# Altium footprint library SAMTEC THD.PcbLib: 161 footprints (part 2 of 12)
Each footprint in its own frame and in the unit in brackets; x right, y up, seen from the top. Pads: shape width x height; smd on the part's side, far side on the other; paste and mask are expansions set on the pad; w line width, h text height; cw(c..) or ccw(c..) is an arc to the next point about the centre after c.
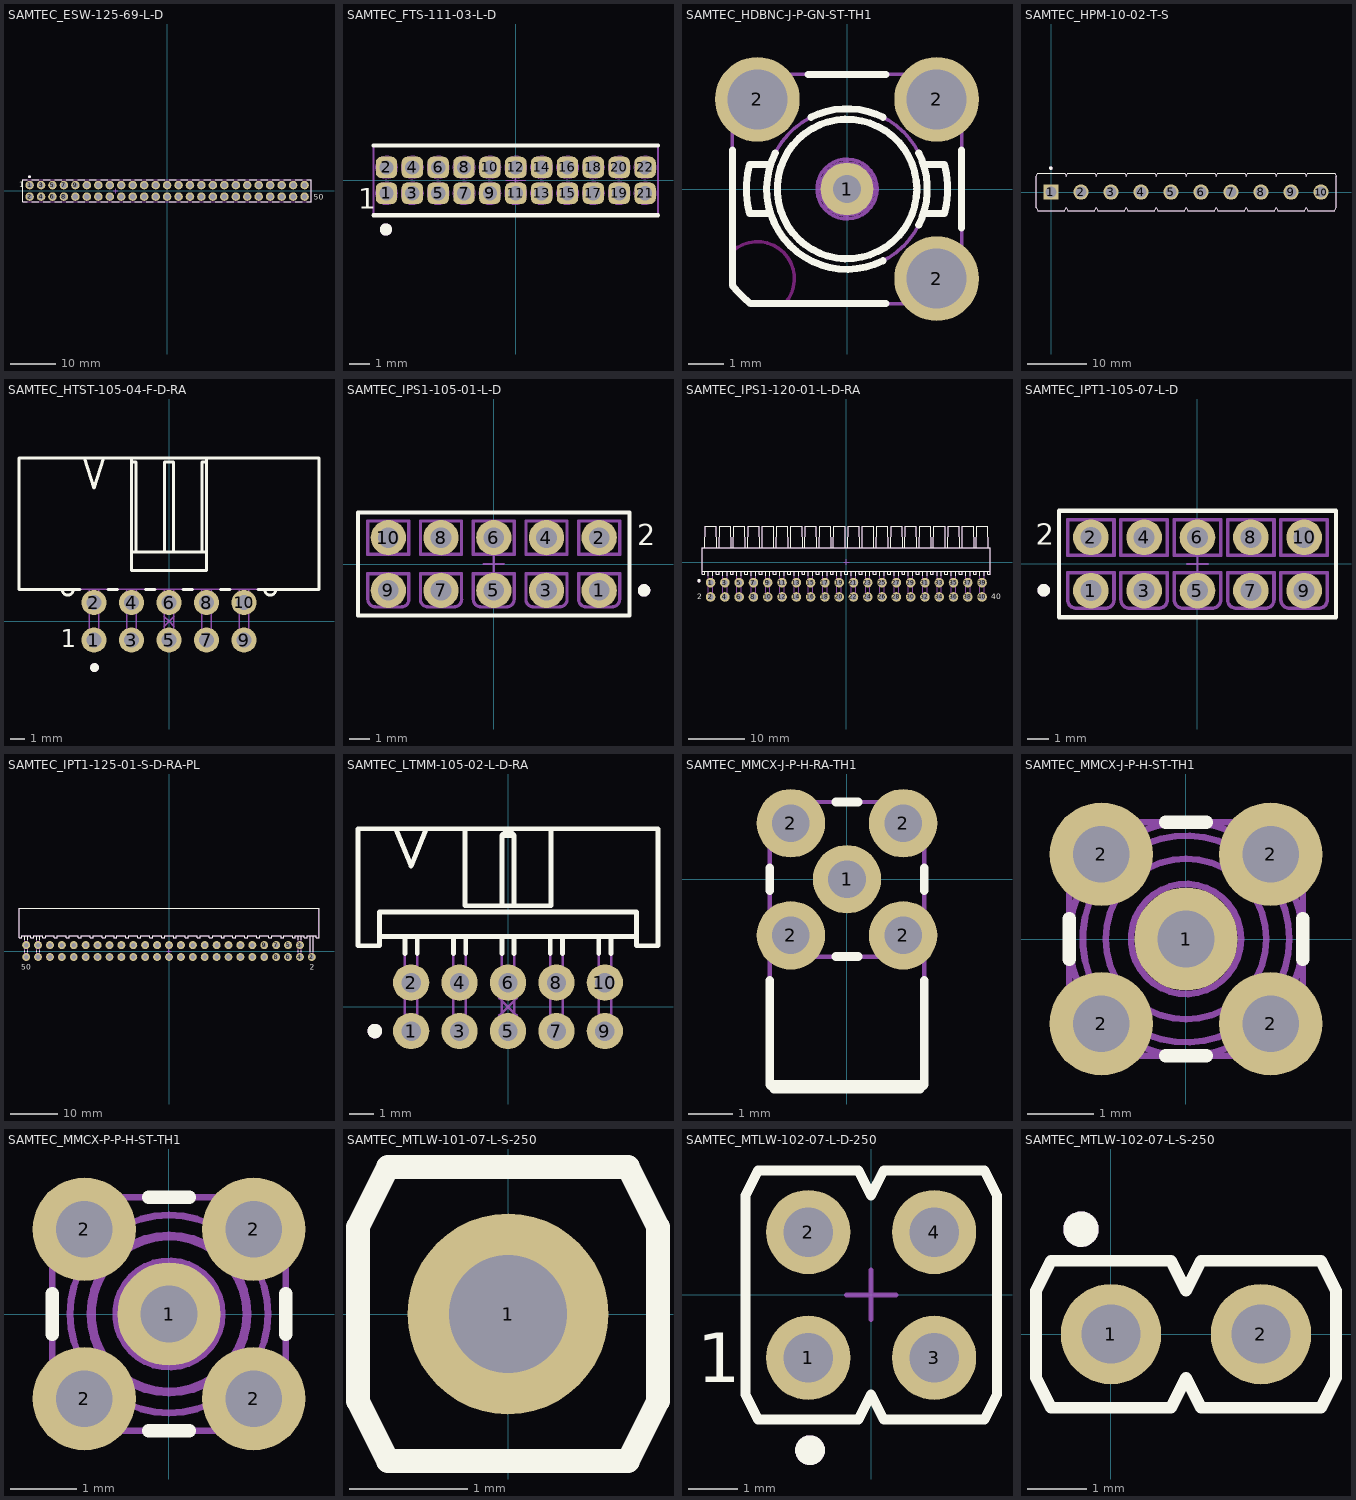
[diagram p1: the footprints below, top view; thin cyan lines are the x and y axes]

## SAMTEC_ESW-125-69-L-D [mm] "50 Contacts, Pitch 2.54mm, Dual Row Through Mount Straight Elevated Socket, Low Insertion Force (Lead Length 4.57mm)"
height 18.67
pads (50):
  round 1.9 hole 1.2: 1(-30.48,1.27) 2(-30.48,-1.27) 3(-27.94,1.27) 4(-27.94,-1.27) 5(-25.4,1.27) 6(-25.4,-1.27) 7(-22.86,1.27) 8(-22.86,-1.27) 9(-20.32,1.27) 10(-20.32,-1.27) 11(-17.78,1.27) 12(-17.78,-1.27) 13(-15.24,1.27) 14(-15.24,-1.27) 15(-12.7,1.27) 16(-12.7,-1.27) 17(-10.16,1.27) 18(-10.16,-1.27) 19(-7.62,1.27) 20(-7.62,-1.27) 21(-5.08,1.27) 22(-5.08,-1.27) 23(-2.54,1.27) 24(-2.54,-1.27) 25(0,1.27) 26(0,-1.27) 27(2.54,1.27) 28(2.54,-1.27) 29(5.08,1.27) 30(5.08,-1.27) 31(7.62,1.27) 32(7.62,-1.27) 33(10.16,1.27) 34(10.16,-1.27) 35(12.7,1.27) 36(12.7,-1.27) 37(15.24,1.27) 38(15.24,-1.27) 39(17.78,1.27) 40(17.78,-1.27) 41(20.32,1.27) 42(20.32,-1.27) 43(22.86,1.27) 44(22.86,-1.27) 45(25.4,1.27) 46(25.4,-1.27) 47(27.94,1.27) 48(27.94,-1.27) 49(30.48,1.27) 50(30.48,-1.27)
Top Overlay:
  circle w0.3: c-30.515,3.135 r0.15
  lines w0.2: -30.964,-2.476 -32.004,-2.476 -32.004,2.476 -30.964,2.476 ; -29.996,-2.476 -28.424,-2.476 ; -29.996,2.476 -28.424,2.476 ; -27.456,-2.476 -25.884,-2.476 ; -27.456,2.476 -25.884,2.476 ; -24.916,-2.476 -23.344,-2.476 ; -24.916,2.476 -23.344,2.476 ; -22.376,-2.476 -20.804,-2.476 ; -22.376,2.476 -20.804,2.476 ; -19.836,-2.476 -18.264,-2.476 ; -19.836,2.476 -18.264,2.476 ; -17.296,-2.476 -15.724,-2.476 ; -17.296,2.476 -15.724,2.476 ; -14.756,-2.476 -13.184,-2.476 ; -14.756,2.476 -13.184,2.476 ; -12.216,-2.476 -10.644,-2.476 ; -12.216,2.476 -10.644,2.476 ; -9.676,-2.476 -8.104,-2.476 ; -9.676,2.476 -8.104,2.476 ; -7.136,-2.476 -5.564,-2.476 ; -7.136,2.476 -5.564,2.476 ; -4.596,-2.476 -3.024,-2.476 ; -4.596,2.476 -3.024,2.476 ; -2.056,-2.476 -0.484,-2.476 ; -2.056,2.476 -0.484,2.476 ; 0.484,-2.476 2.056,-2.476 ; 0.484,2.476 2.056,2.476 ; 3.024,-2.476 4.596,-2.476 ; 3.024,2.476 4.596,2.476 ; 5.564,-2.476 7.136,-2.476 ; 5.564,2.476 7.136,2.476 ; 8.104,-2.476 9.676,-2.476 ; 8.104,2.476 9.676,2.476 ; 10.644,-2.476 12.216,-2.476 ; 10.644,2.476 12.216,2.476 ; 13.184,-2.476 14.756,-2.476 ; 13.184,2.476 14.756,2.476 ; 15.724,-2.476 17.296,-2.476 ; 15.724,2.476 17.296,2.476 ; 18.264,-2.476 19.836,-2.476 ; 18.264,2.476 19.836,2.476 ; 20.804,-2.476 22.376,-2.476 ; 20.804,2.476 22.376,2.476 ; 23.344,-2.476 24.916,-2.476 ; 23.344,2.476 24.916,2.476 ; 25.884,-2.476 27.456,-2.476 ; 25.884,2.476 27.456,2.476 ; 28.424,-2.476 29.996,-2.476 ; 28.424,2.476 29.996,2.476 ; 30.964,-2.476 32.004,-2.476 32.004,2.476 30.964,2.476
  text "1" at -32.827,0.772 h1.2
  text "50" at 32.485,-1.925 h1.2
Mechanical 8:
  drawing of 204 lines, arcs and shapes, not listed
Mechanical 14:
  drawing of 205 lines, arcs and shapes, not listed
  text "1" at -32.827,0.772 h1.2
  text "50" at 32.485,-1.925 h1.2
3D body "SAMTEC_ESW-125-69-L-D.stp": height 18.67, standoff -4.57, extent -32.004,-2.54 32.004,2.54

## SAMTEC_FTS-111-03-L-D [mm] "22 Contacts - Pitch 1.27mm - Dual Row THD Straight Strip Header"
height 2.51
pads (22):
  rrect50% 1.05x1.05 hole 0.7: 1(-6.35,-0.635) 2(-6.35,0.635) 3(-5.08,-0.635) 4(-5.08,0.635) 5(-3.81,-0.635) 6(-3.81,0.635) 7(-2.54,-0.635) 8(-2.54,0.635) 9(-1.27,-0.635) 10(-1.27,0.635) 11(0,-0.635) 12(0,0.635) 13(1.27,-0.635) 14(1.27,0.635) 15(2.54,-0.635) 16(2.54,0.635) 17(3.81,-0.635) 18(3.81,0.635) 19(5.08,-0.635) 20(5.08,0.635) 21(6.35,-0.635) 22(6.35,0.635)
Top Overlay:
  circle w0.3: c-6.373,-2.413 r0.15
  lines w0.2: -6.985,-1.714 6.985,-1.714 ; -6.985,1.714 6.985,1.714
  text "1" at -7.747,-1.397 h1
Mechanical 8:
  circle w0.05: c0,0.635 r0.35
  circle w0.05: c0,0.635 r0.55
  circle w0.05: c0,-0.635 r0.35
  circle w0.05: c0,-0.635 r0.55
  circle w0.05: c1.27,0.635 r0.35
  circle w0.05: c1.27,0.635 r0.55
  circle w0.05: c1.27,-0.635 r0.35
  circle w0.05: c1.27,-0.635 r0.55
  circle w0.05: c2.54,0.635 r0.35
  circle w0.05: c2.54,0.635 r0.55
  circle w0.05: c2.54,-0.635 r0.35
  circle w0.05: c2.54,-0.635 r0.55
  circle w0.05: c3.81,0.635 r0.35
  circle w0.05: c3.81,0.635 r0.55
  circle w0.05: c3.81,-0.635 r0.35
  circle w0.05: c3.81,-0.635 r0.55
  circle w0.05: c-1.27,0.635 r0.35
  circle w0.05: c-1.27,0.635 r0.55
  circle w0.05: c-1.27,-0.635 r0.35
  circle w0.05: c-1.27,-0.635 r0.55
  circle w0.05: c-2.54,0.635 r0.35
  circle w0.05: c-2.54,0.635 r0.55
  circle w0.05: c-2.54,-0.635 r0.35
  circle w0.05: c-2.54,-0.635 r0.55
  circle w0.05: c-3.81,0.635 r0.35
  circle w0.05: c-3.81,0.635 r0.55
  circle w0.05: c-3.81,-0.635 r0.35
  circle w0.05: c-3.81,-0.635 r0.55
  circle w0.05: c-5.08,0.635 r0.35
  circle w0.05: c-5.08,0.635 r0.55
  circle w0.05: c-5.08,-0.635 r0.35
  circle w0.05: c-5.08,-0.635 r0.55
  circle w0.05: c-6.35,0.635 r0.35
  circle w0.05: c-6.35,0.635 r0.55
  circle w0.05: c-6.35,-0.635 r0.35
  circle w0.05: c-6.35,-0.635 r0.55
  circle w0.05: c5.08,0.635 r0.35
  circle w0.05: c5.08,0.635 r0.55
  circle w0.05: c5.08,-0.635 r0.35
  circle w0.05: c5.08,-0.635 r0.55
  circle w0.05: c6.35,0.635 r0.35
  circle w0.05: c6.35,0.635 r0.55
  circle w0.05: c6.35,-0.635 r0.35
  circle w0.05: c6.35,-0.635 r0.55
  lines w0.05: -6.85,-0.635 -6.35,-0.635 ; -6.85,0.635 -6.35,0.635 ; -6.35,-1.135 -6.35,-0.635 ; -6.35,-0.135 -6.35,-0.635 ; -6.35,0.135 -6.35,0.635 ; -6.35,1.135 -6.35,0.635 ; -5.85,-0.635 -6.35,-0.635 ; -5.85,0.635 -6.35,0.635 ; -5.58,-0.635 -5.08,-0.635 ; -5.58,0.635 -5.08,0.635 ; -5.08,-1.135 -5.08,-0.635 ; -5.08,-0.135 -5.08,-0.635 ; -5.08,0.135 -5.08,0.635 ; -5.08,1.135 -5.08,0.635 ; -4.58,-0.635 -5.08,-0.635 ; -4.58,0.635 -5.08,0.635 ; -4.31,-0.635 -3.81,-0.635 ; -4.31,0.635 -3.81,0.635 ; -3.81,-1.135 -3.81,-0.635 ; -3.81,-0.135 -3.81,-0.635 ; -3.81,0.135 -3.81,0.635 ; -3.81,1.135 -3.81,0.635 ; -3.31,-0.635 -3.81,-0.635 ; -3.31,0.635 -3.81,0.635 ; -3.04,-0.635 -2.54,-0.635 ; -3.04,0.635 -2.54,0.635 ; -2.54,-1.135 -2.54,-0.635 ; -2.54,-0.135 -2.54,-0.635 ; -2.54,0.135 -2.54,0.635 ; -2.54,1.135 -2.54,0.635 ; -2.04,-0.635 -2.54,-0.635 ; -2.04,0.635 -2.54,0.635 ; -1.77,-0.635 -1.27,-0.635 ; -1.77,0.635 -1.27,0.635 ; -1.27,-1.135 -1.27,-0.635 ; -1.27,-0.135 -1.27,-0.635 ; -1.27,0.135 -1.27,0.635 ; -1.27,1.135 -1.27,0.635 ; -0.77,-0.635 -1.27,-0.635 ; -0.77,0.635 -1.27,0.635 ; -0.5,-0.635 0,-0.635 ; -0.5,0 0,0 ; -0.5,0.635 0,0.635 ; 0,-1.135 0,-0.635 ; 0,-0.5 0,0 ; 0,-0.135 0,-0.635 ; 0,0.135 0,0.635 ; 0,0.5 0,0 ; 0,1.135 0,0.635 ; 0.5,-0.635 0,-0.635 ; 0.5,0 0,0 ; 0.5,0.635 0,0.635 ; 0.77,-0.635 1.27,-0.635 ; 0.77,0.635 1.27,0.635 ; 1.27,-1.135 1.27,-0.635 ; 1.27,-0.135 1.27,-0.635 ; 1.27,0.135 1.27,0.635 ; 1.27,1.135 1.27,0.635 ; 1.77,-0.635 1.27,-0.635 ; 1.77,0.635 1.27,0.635 ; 2.04,-0.635 2.54,-0.635 ; 2.04,0.635 2.54,0.635 ; 2.54,-1.135 2.54,-0.635 ; 2.54,-0.135 2.54,-0.635 ; 2.54,0.135 2.54,0.635 ; 2.54,1.135 2.54,0.635 ; 3.04,-0.635 2.54,-0.635 ; 3.04,0.635 2.54,0.635 ; 3.31,-0.635 3.81,-0.635 ; 3.31,0.635 3.81,0.635 ; 3.81,-1.135 3.81,-0.635 ; 3.81,-0.135 3.81,-0.635 ; 3.81,0.135 3.81,0.635 ; 3.81,1.135 3.81,0.635 ; 4.31,-0.635 3.81,-0.635 ; 4.31,0.635 3.81,0.635 ; 4.58,-0.635 5.08,-0.635 ; 4.58,0.635 5.08,0.635 ; 5.08,-1.135 5.08,-0.635 ; 5.08,-0.135 5.08,-0.635 ; 5.08,0.135 5.08,0.635 ; 5.08,1.135 5.08,0.635 ; 5.58,-0.635 5.08,-0.635 ; 5.58,0.635 5.08,0.635 ; 5.85,-0.635 6.35,-0.635 ; 5.85,0.635 6.35,0.635 ; 6.35,-1.135 6.35,-0.635 ; 6.35,-0.135 6.35,-0.635 ; 6.35,0.135 6.35,0.635 ; 6.35,1.135 6.35,0.635 ; 6.85,-0.635 6.35,-0.635 ; 6.85,0.635 6.35,0.635
Mechanical 14:
  circle w0.3: c-6.373,-2.413 r0.15
  lines w0.1: -6.985,-1.714 -6.985,1.714 6.985,1.714 6.985,-1.714 -6.985,-1.714 ; -6.553,-0.838 -6.147,-0.838 -6.147,-0.432 -6.553,-0.432 -6.553,-0.838 ; -6.553,0.432 -6.147,0.432 -6.147,0.838 -6.553,0.838 -6.553,0.432 ; -5.283,-0.838 -4.877,-0.838 -4.877,-0.432 -5.283,-0.432 -5.283,-0.838 ; -5.283,0.432 -4.877,0.432 -4.877,0.838 -5.283,0.838 -5.283,0.432 ; -4.013,-0.838 -3.607,-0.838 -3.607,-0.432 -4.013,-0.432 -4.013,-0.838 ; -4.013,0.432 -3.607,0.432 -3.607,0.838 -4.013,0.838 -4.013,0.432 ; -2.743,-0.838 -2.337,-0.838 -2.337,-0.432 -2.743,-0.432 -2.743,-0.838 ; -2.743,0.432 -2.337,0.432 -2.337,0.838 -2.743,0.838 -2.743,0.432 ; -1.473,-0.838 -1.067,-0.838 -1.067,-0.432 -1.473,-0.432 -1.473,-0.838 ; -1.473,0.432 -1.067,0.432 -1.067,0.838 -1.473,0.838 -1.473,0.432 ; -0.203,-0.838 0.203,-0.838 0.203,-0.432 -0.203,-0.432 -0.203,-0.838 ; -0.203,0.432 0.203,0.432 0.203,0.838 -0.203,0.838 -0.203,0.432 ; 1.067,-0.838 1.473,-0.838 1.473,-0.432 1.067,-0.432 1.067,-0.838 ; 1.067,0.432 1.473,0.432 1.473,0.838 1.067,0.838 1.067,0.432 ; 2.337,-0.838 2.743,-0.838 2.743,-0.432 2.337,-0.432 2.337,-0.838 ; 2.337,0.432 2.743,0.432 2.743,0.838 2.337,0.838 2.337,0.432 ; 3.607,-0.838 4.013,-0.838 4.013,-0.432 3.607,-0.432 3.607,-0.838 ; 3.607,0.432 4.013,0.432 4.013,0.838 3.607,0.838 3.607,0.432 ; 4.877,-0.838 5.283,-0.838 5.283,-0.432 4.877,-0.432 4.877,-0.838 ; 4.877,0.432 4.877,0.838 5.283,0.838 5.283,0.432 4.877,0.432 ; 6.147,-0.838 6.553,-0.838 6.553,-0.432 6.147,-0.432 6.147,-0.838 ; 6.147,0.432 6.147,0.838 6.553,0.838 6.553,0.432 6.147,0.432
  text "1" at -7.747,-1.397 h1
3D body "SAMTEC_FTS-111-03-L-D.stp": height 2.51, standoff -2.29, extent -6.985,-1.714 6.985,1.715

## SAMTEC_HDBNC-J-P-GN-ST-TH1 [mm] "75 Ohm BNC Straight Through-hole PCB Jack"
height 8.25
pads (4):
  round 1.5 hole 0.8: 1(0,0)
  round 2.4 hole 1.7: 2(-2.54,2.54) 2(2.54,-2.54) 2(2.54,2.54)
Top Layer keep-out:
  lines w0.1: -3.25,-2.739 ccw(c0,0) -2.739,-3.25 -1.766,-3.25 ccw(c-2.54,-2.54) -3.25,-1.766 -3.25,-2.739
Top Overlay:
  circle w0.2: c0,0 r1.977
  lines w0.2: -3.25,1.106 -3.25,-2.739 ccw(c0,0) -2.739,-3.25 1.106,-3.25 ; -2.165,-0.7 -2.768,-0.7 cw(c0,0) -2.768,0.7 -2.165,0.7 ; -2.032,1.023 ccw(c0,0) 1.023,-2.032 ; -1.106,3.25 1.106,3.25 ; -1.023,2.032 cw(c0,0) 1.023,2.032 ; 2.032,-1.023 ccw(c0,0) 2.032,1.023 ; 2.165,-0.7 2.768,-0.7 ccw(c0,0) 2.768,0.7 2.165,0.7 ; 3.25,-1.106 3.25,1.106
Mechanical 8:
  circle w0.1: c0,0 r0.75
  lines w0.1: -3.04,2.54 -2.54,2.54 ; -2.54,2.04 -2.54,2.54 ; -2.54,3.04 -2.54,2.54 ; -2.04,2.54 -2.54,2.54 ; -0.5,0 0,0 ; 0,-0.5 0,0 ; 0,0.5 0,0 ; 0.5,0 0,0 ; 2.04,-2.54 2.54,-2.54 ; 2.04,2.54 2.54,2.54 ; 2.54,-3.04 2.54,-2.54 ; 2.54,-2.04 2.54,-2.54 ; 2.54,2.04 2.54,2.54 ; 2.54,3.04 2.54,2.54 ; 3.04,-2.54 2.54,-2.54 ; 3.04,2.54 2.54,2.54
Mechanical 14:
  circle w0.1: c0,0 r2.275
  circle w0.1: c0,0 r0.215
  circle w0.1: c0,0 r0.65
  circle w0.1: c0,0 r0.85
  circle w0.1: c0,0 r1.977
  lines w0.1: -2.165,-0.7 -2.768,-0.7 cw(c0,0) -2.768,0.7 -2.165,0.7 ; 2.165,-0.7 2.768,-0.7 ccw(c0,0) 2.768,0.7 2.165,0.7 ; -3.25,-2.739 ccw(c0,0) -2.739,-3.25 2.739,-3.25 ccw(c0,0) 3.25,-2.739 3.25,2.739 ccw(c0,0) 2.739,3.25 -2.739,3.25 ccw(c0,0) -3.25,2.739 -3.25,-2.739
3D body "SAMTEC_HDBNC-J-P-GN-ST-TH1.stp": height 8.25, standoff -4, extent -3.25,-3.25 3.25,3.25

## SAMTEC_HPM-10-02-T-S [mm] "10 Contacts - Pitch 5.08mm - Single Row  Through Mount Straigh Header (Post Lead 13.21mm, Tail Lead 4.57mm, Insulator 2.54mm)"
height 15.75
pads (10):
  rect 2.6x2.6 hole 1.9: 1(0,0)
  round 2.6 hole 1.9: 2(5.08,0) 3(10.16,0) 4(15.24,0) 5(20.32,0) 6(25.4,0) 7(30.48,0) 8(35.56,0) 9(40.64,0) 10(45.72,0)
Top Overlay:
  circle w0.3: c-0.023,4.064 r0.15
  lines w0.2: -2.54,-2.667 -2.286,-3.175 2.286,-3.175 2.54,-2.667 2.794,-3.175 7.366,-3.175 7.62,-2.667 7.874,-3.175 12.446,-3.175 12.7,-2.667 12.954,-3.175 17.526,-3.175 17.78,-2.667 18.034,-3.175 22.606,-3.175 22.86,-2.667 23.114,-3.175 27.686,-3.175 27.94,-2.667 28.194,-3.175 32.766,-3.175 33.02,-2.667 33.274,-3.175 37.846,-3.175 38.1,-2.667 38.354,-3.175 42.926,-3.175 43.18,-2.667 43.434,-3.175 48.006,-3.175 48.26,-2.667 48.26,2.667 48.006,3.175 43.434,3.175 43.18,2.667 42.926,3.175 38.354,3.175 38.1,2.667 37.846,3.175 33.274,3.175 33.02,2.667 32.766,3.175 28.194,3.175 27.94,2.667 27.686,3.175 23.114,3.175 22.86,2.667 22.606,3.175 18.034,3.175 17.78,2.667 17.526,3.175 12.954,3.175 12.7,2.667 12.446,3.175 7.874,3.175 7.62,2.667 7.366,3.175 2.794,3.175 2.54,2.667 2.286,3.175 -2.286,3.175 -2.54,2.667 -2.54,-2.667
Mechanical 8:
  lines w0.05: -0.5,0 0,0 ; 0,-0.5 0,0 ; 0,0.5 0,0 ; 0.5,0 0,0 ; 4.58,0 5.08,0 ; 5.08,-0.5 5.08,0 ; 5.08,0.5 5.08,0 ; 5.58,0 5.08,0 ; 9.66,0 10.16,0 ; 10.16,-0.5 10.16,0 ; 10.16,0.5 10.16,0 ; 10.66,0 10.16,0 ; 14.74,0 15.24,0 ; 15.24,-0.5 15.24,0 ; 15.24,0.5 15.24,0 ; 15.74,0 15.24,0 ; 19.82,0 20.32,0 ; 20.32,-0.5 20.32,0 ; 20.32,0.5 20.32,0 ; 20.82,0 20.32,0 ; 24.9,0 25.4,0 ; 25.4,-0.5 25.4,0 ; 25.4,0.5 25.4,0 ; 25.9,0 25.4,0 ; 29.98,0 30.48,0 ; 30.48,-0.5 30.48,0 ; 30.48,0.5 30.48,0 ; 30.98,0 30.48,0 ; 35.06,0 35.56,0 ; 35.56,-0.5 35.56,0 ; 35.56,0.5 35.56,0 ; 36.06,0 35.56,0 ; 40.14,0 40.64,0 ; 40.64,-0.5 40.64,0 ; 40.64,0.5 40.64,0 ; 41.14,0 40.64,0 ; 45.22,0 45.72,0 ; 45.72,-0.5 45.72,0 ; 45.72,0.5 45.72,0 ; 46.22,0 45.72,0
Mechanical 14:
  circle w0.3: c-0.023,4.064 r0.15
  lines w0.1: -2.54,-2.667 -2.286,-3.175 2.286,-3.175 2.54,-2.667 2.794,-3.175 7.366,-3.175 7.62,-2.667 7.874,-3.175 12.446,-3.175 12.7,-2.667 12.954,-3.175 17.526,-3.175 17.78,-2.667 18.034,-3.175 22.606,-3.175 22.86,-2.667 23.114,-3.175 27.686,-3.175 27.94,-2.667 28.194,-3.175 32.766,-3.175 33.02,-2.667 33.274,-3.175 37.846,-3.175 38.1,-2.667 38.354,-3.175 42.926,-3.175 43.18,-2.667 43.434,-3.175 48.006,-3.175 48.26,-2.667 48.26,2.667 48.006,3.175 43.434,3.175 43.18,2.667 42.926,3.175 38.354,3.175 38.1,2.667 37.846,3.175 33.274,3.175 33.02,2.667 32.766,3.175 28.194,3.175 27.94,2.667 27.686,3.175 23.114,3.175 22.86,2.667 22.606,3.175 18.034,3.175 17.78,2.667 17.526,3.175 12.954,3.175 12.7,2.667 12.446,3.175 7.874,3.175 7.62,2.667 7.366,3.175 2.794,3.175 2.54,2.667 2.286,3.175 -2.286,3.175 -2.54,2.667 -2.54,-2.667 ; -0.57,-0.57 0.57,-0.57 0.57,0.57 -0.57,0.57 -0.57,-0.57 ; 4.51,-0.57 5.65,-0.57 5.65,0.57 4.51,0.57 4.51,-0.57 ; 9.59,-0.57 10.73,-0.57 10.73,0.57 9.59,0.57 9.59,-0.57 ; 14.67,-0.57 15.81,-0.57 15.81,0.57 14.67,0.57 14.67,-0.57 ; 19.75,-0.57 20.89,-0.57 20.89,0.57 19.75,0.57 19.75,-0.57 ; 24.83,-0.57 25.97,-0.57 25.97,0.57 24.83,0.57 24.83,-0.57 ; 29.91,-0.57 31.05,-0.57 31.05,0.57 29.91,0.57 29.91,-0.57 ; 34.99,-0.57 36.13,-0.57 36.13,0.57 34.99,0.57 34.99,-0.57 ; 40.07,-0.57 41.21,-0.57 41.21,0.57 40.07,0.57 40.07,-0.57 ; 45.15,-0.57 46.29,-0.57 46.29,0.57 45.15,0.57 45.15,-0.57
3D body "SAMTEC_HPM-10-02-T-S.stp": height 15.75, standoff -4.57, extent -2.54,-3.175 48.26,3.175

## SAMTEC_HTST-105-04-F-D-RA [mm] "10 Contacts - Pitch 2.54mm - Dual Row Surface Mount Right Angle Shrouded Header"
height 9.27
pads (10):
  round 1.7 hole 1: 1(-5.08,-1.27) 2(-5.08,1.27) 3(-2.54,-1.27) 4(-2.54,1.27) 5(0,-1.27) 6(0,1.27) 7(2.54,-1.27) 8(2.54,1.27) 9(5.08,-1.27) 10(5.08,1.27)
Top Overlay:
  circle w0.3: c-5.045,-3.135 r0.15
  lines w0.2: -7.239,2.159 ccw(c-6.858,2.159) -6.477,2.159 ; -6.029,2.159 -10.16,2.159 -10.16,11.049 10.16,11.049 10.16,2.159 6.029,2.159 ; -5.715,11.049 -5.08,9.017 -4.445,11.049 ; -4.131,2.159 -3.489,2.159 ; -2.54,4.699 2.54,4.699 ; -2.54,10.795 -2.222,10.795 -2.222,4.699 ; -2.54,11.049 -2.54,3.429 2.54,3.429 2.54,11.049 ; -1.591,2.159 -0.949,2.159 ; -0.318,4.699 -0.318,10.795 0.318,10.795 0.318,4.699 ; 0.949,2.159 1.591,2.159 ; 2.222,4.699 2.222,10.795 2.54,10.795 ; 3.489,2.159 4.131,2.159 ; 6.477,2.159 ccw(c6.858,2.159) 7.239,2.159
  text "1" at -7.327,-1.768 h1.2
Mechanical 8:
  lines w0.1: -5.58,-1.27 -5.08,-1.27 ; -5.58,1.27 -5.08,1.27 ; -5.08,-1.77 -5.08,-1.27 ; -5.08,-0.77 -5.08,-1.27 ; -5.08,0.77 -5.08,1.27 ; -5.08,1.77 -5.08,1.27 ; -4.58,-1.27 -5.08,-1.27 ; -4.58,1.27 -5.08,1.27 ; -3.04,-1.27 -2.54,-1.27 ; -3.04,1.27 -2.54,1.27 ; -2.54,-1.77 -2.54,-1.27 ; -2.54,-0.77 -2.54,-1.27 ; -2.54,0.77 -2.54,1.27 ; -2.54,1.77 -2.54,1.27 ; -2.04,-1.27 -2.54,-1.27 ; -2.04,1.27 -2.54,1.27 ; -0.5,-1.27 0,-1.27 ; -0.5,1.27 0,1.27 ; -0.354,-0.354 0,0 ; -0.354,0.354 0,0 ; 0,-1.77 0,-1.27 ; 0,-0.77 0,-1.27 ; 0,0.77 0,1.27 ; 0,1.77 0,1.27 ; 0.354,-0.354 0,0 ; 0.354,0.354 0,0 ; 0.5,-1.27 0,-1.27 ; 0.5,1.27 0,1.27 ; 2.04,-1.27 2.54,-1.27 ; 2.04,1.27 2.54,1.27 ; 2.54,-1.77 2.54,-1.27 ; 2.54,-0.77 2.54,-1.27 ; 2.54,0.77 2.54,1.27 ; 2.54,1.77 2.54,1.27 ; 3.04,-1.27 2.54,-1.27 ; 3.04,1.27 2.54,1.27 ; 4.58,-1.27 5.08,-1.27 ; 4.58,1.27 5.08,1.27 ; 5.08,-1.77 5.08,-1.27 ; 5.08,-0.77 5.08,-1.27 ; 5.08,0.77 5.08,1.27 ; 5.08,1.77 5.08,1.27 ; 5.58,-1.27 5.08,-1.27 ; 5.58,1.27 5.08,1.27
Mechanical 14:
  circle w0.3: c-5.045,-3.135 r0.15
  lines w0.1: -7.239,2.159 ccw(c-6.858,2.159) -6.477,2.159 ; -5.715,11.049 -5.08,9.017 -4.445,11.049 ; -5.397,2.159 -5.397,-1.587 -4.763,-1.587 -4.763,2.175 ; -2.857,2.159 -2.857,-1.587 -2.222,-1.587 -2.222,2.175 ; -2.54,4.699 2.54,4.699 ; -2.54,10.795 -2.222,10.795 -2.222,4.699 ; -2.54,11.049 -2.54,3.429 2.54,3.429 2.54,11.049 ; -0.318,2.159 -0.318,-1.587 0.318,-1.587 0.318,2.175 ; -0.318,4.699 -0.318,10.795 0.318,10.795 0.318,4.699 ; 2.222,2.159 2.222,-1.587 2.857,-1.587 2.857,2.175 ; 2.222,4.699 2.222,10.795 2.54,10.795 ; 4.763,2.159 4.763,-1.587 5.397,-1.587 5.397,2.175 ; 6.477,2.159 ccw(c6.858,2.159) 7.239,2.159 ; -10.16,2.159 -10.16,11.049 10.16,11.049 10.16,2.159 -10.16,2.159
  text "1" at -7.327,-1.768 h1.2
3D body "SAMTEC_HTST-105-04-F-D-RA.stp": height 9.27, standoff -3.3, extent -10.16,-1.587 10.16,11.049
